# Altium footprint library Connectors.PcbLib: 155 footprints (part 2 of 10)
Each footprint in its own frame and in the unit in brackets; x right, y up, seen from the top. Pads: shape width x height; smd on the part's side, far side on the other; paste and mask are expansions set on the pad; w line width, h text height; cw(c..) or ccw(c..) is an arc to the next point about the centre after c.
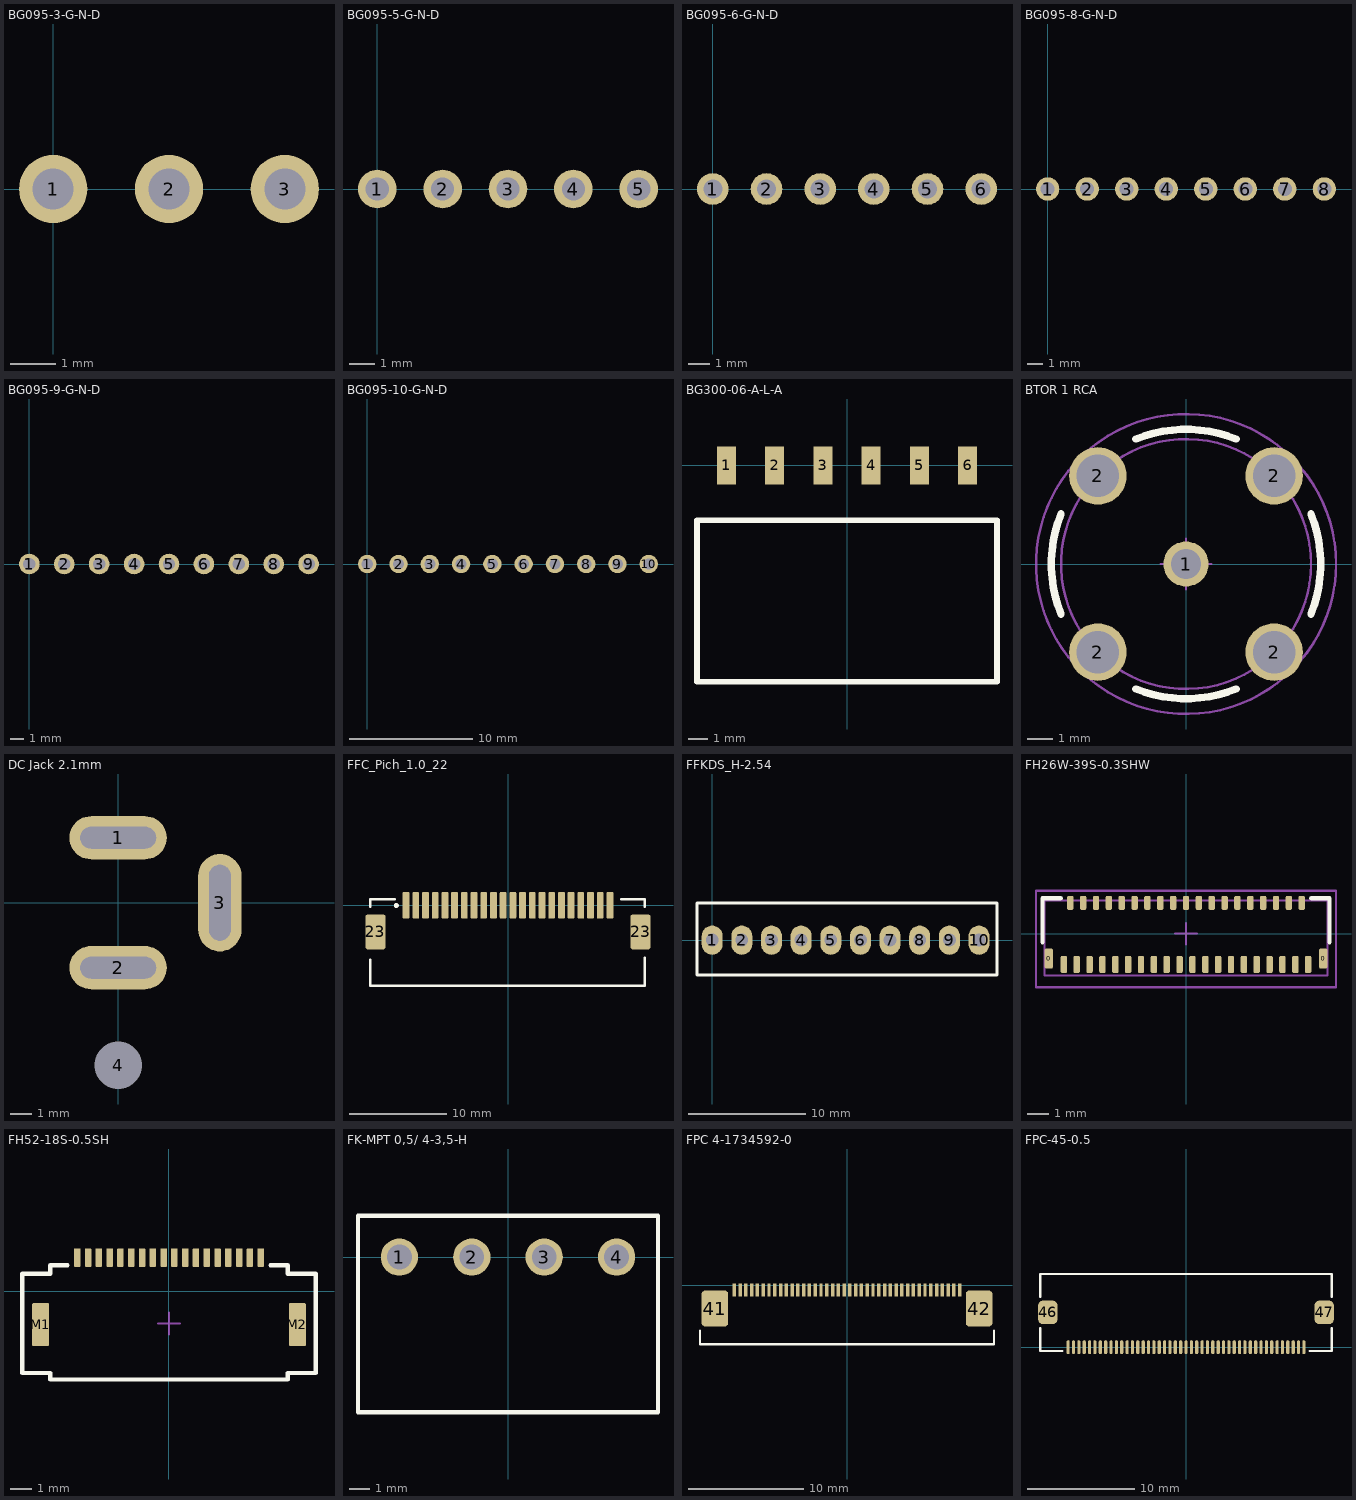
[diagram p1: the footprints below, top view; thin cyan lines are the x and y axes]

## BG095-3-G-N-D [mm] "BG095-3-G-N-D"
height 5
pads (3):
  round 1.5 hole 0.9: 1(0,0) 2(2.54,0) 3(5.08,0)
3D body: height 5, standoff -2.92, extent -1.32,-1.295 6.3,1.245

## BG095-5-G-N-D [mm] "BG095-5-G-N-D"
height 5
pads (5):
  round 1.5 hole 0.9: 1(0,0) 2(2.54,0) 3(5.08,0) 4(7.62,0) 5(10.16,0)
3D body: height 5, standoff -2.92, extent -1.325,-1.275 11.375,1.265

## BG095-6-G-N-D [mm] "BG095-6-G-N-D"
height 5
pads (6):
  round 1.5 hole 0.9: 1(0,0) 2(2.54,0) 3(5.08,0) 4(7.62,0) 5(10.16,0) 6(12.7,0)
3D body: height 5, standoff -2.92, extent -1.32,-1.295 13.92,1.245

## BG095-8-G-N-D [mm] "BG095-8-G-N-D"
height 5
pads (8):
  round 1.5 hole 0.9: 1(0,0) 2(2.54,0) 3(5.08,0) 4(7.62,0) 5(10.16,0) 6(12.7,0) 7(15.24,0) 8(17.78,0)
3D body: height 5, standoff -2.92, extent -1.32,-1.295 19,1.245

## BG095-9-G-N-D [mm] "BG095-9-G-N-D"
height 5
pads (9):
  round 1.5 hole 0.9: 1(0,0) 2(2.54,0) 3(5.08,0) 4(7.62,0) 5(10.16,0) 6(12.7,0) 7(15.24,0) 8(17.78,0) 9(20.32,0)
3D body: height 5, standoff -2.92, extent -1.32,-1.295 21.54,1.245

## BG095-10-G-N-D [mm] "BG095-10-G-N-D"
height 5
pads (10):
  round 1.5 hole 0.9: 1(0,0) 2(2.54,0) 3(5.08,0) 4(7.62,0) 5(10.16,0) 6(12.7,0) 7(15.24,0) 8(17.78,0) 9(20.32,0) 10(22.86,0)
3D body: height 5, standoff -2.92, extent -1.32,-1.295 21.54,1.245

## BG300-06-A-L-A [mm] "Board-To-Board Connector, Right Angle, White Lite"
pads (6):
  rect 1x2 smd: 1(-6.35,0) 2(-3.81,0) 3(-1.27,0) 4(1.27,0) 5(3.81,0) 6(6.35,0)
Top Overlay:
  lines w0.3: -7.9,-11.4 -7.9,-2.9 0,-2.9 7.9,-2.9 7.9,-11.4 -7.9,-11.4
3D body: height 2.5, standoff 0, extent -7.899,-11.399 7.899,-2.901

## BTOR 1 RCA [mm] "RCA connector from Lumberg"
height 17
pads (5):
  round 1.8 hole 1.2: 1(0,0)
  round 2.3 hole 1.7: 2(-3.525,-3.525) 2(-3.525,3.525) 2(3.525,-3.525) 2(3.525,3.525)
Top Overlay:
  lines w0.3: -5,-2 cw(c0,0) -5,2 ; -2,-5 ccw(c0,0) 2,-5 ; -2,5 cw(c0,0) 2,5 ; 5,-2 ccw(c0,0) 5,2
Mechanical 13:
  circle w0.1: c0,0 r5
Mechanical 15:
  circle w0.1: c0,0 r6
  lines w0.1: -1,0 1,0 ; 0,-1 0,1
3D body: height 17, standoff -5, extent -7.071,-7.071 7.071,7.071

## DC Jack 2.1mm [mm] "DC Jack 2.1mm"
pads (4):
  oval 4.5x2 hole 1 slot 3.5 at 0 deg: 1(0,3) 2(0,-3)
  oval 2x4.5 hole 1 slot 3.5 at 90 deg: 3(4.7,0)
  round 1 hole 2.2 unplated: 4(0,-7.5)
3D body: height 11, standoff -3.5, extent -4.478,-11.5 4.878,3.8

## FFC_Pich_1.0_22 [mm] "FFC_Pich_1.0_22"
height 2.7
pads (24):
  rrect25% 0.7x2.7 smd: 1(-10.5,0) 2(-9.5,0) 3(-8.5,0) 4(-7.5,0) 5(-6.5,0) 6(-5.5,0) 7(-4.5,0) 8(-3.5,0) 9(-2.5,0) 10(-1.5,0) 11(-0.5,0) 12(0.5,0) 13(1.5,0) 14(2.5,0) 15(3.5,0) 16(4.5,0) 17(5.5,0) 18(6.5,0) 19(7.5,0) 20(8.5,0) 21(9.5,0) 22(10.5,0)
  rrect25% 2.1x3.6 smd: 23(-13.65,-2.75) 23(13.65,-2.75)
Top Overlay:
  circle w0.254: c-11.5,-0.025 r0.125
  lines w0.254: -14.2,-5.6 -14.2,-8.3 14.1,-8.3 14.1,-5.4 ; -14.2,-0.15 -14.2,0.6 -11.65,0.6 ; 11.65,0.6 14.1,0.6 14.1,-0.15
3D body: height 2.7, standoff 0, extent -14.2,-8.3 14.1,0.6

## FFKDS_H-2.54 [mm] "FFKDS_H-2.54"
height 13.6
pads (10):
  oval 1.8x2.5 hole 1.1: 1(0,0) 2(2.54,0) 3(5.08,0) 4(7.62,0) 5(10.16,0) 6(12.7,0) 7(15.24,0) 8(17.78,0) 9(20.32,0) 10(22.86,0)
Top Overlay:
  lines w0.254: -1.3,-3 24.4,-3 24.4,3.2 -1.3,3.2 -1.3,-3

## FH26W-39S-0.3SHW [mm] "0.3mm Pitch, 2-row FPC Connector"
height 1
pads (41):
  rrect50% 0.4x0.95 smd: 0(-6.4,-1.162) 0(6.4,-1.163)
  rrect50% 0.3x0.8 smd: 1(-5.7,-1.438) 3(-5.1,-1.438) 5(-4.5,-1.438) 7(-3.9,-1.438) 9(-3.3,-1.438) 11(-2.7,-1.438) 13(-2.1,-1.438) 15(-1.5,-1.438) 17(-0.9,-1.438) 19(-0.3,-1.438) 21(0.3,-1.438) 23(0.9,-1.438) 25(1.5,-1.438) 27(2.1,-1.438) 29(2.7,-1.438) 31(3.3,-1.438) 33(3.9,-1.438) 35(4.5,-1.438) 37(5.1,-1.438) 39(5.7,-1.438)
  rrect50% 0.3x0.65 smd: 2(-5.4,1.438) 4(-4.8,1.438) 6(-4.2,1.438) 8(-3.6,1.438) 10(-3,1.438) 12(-2.4,1.438) 14(-1.8,1.438) 16(-1.2,1.438) 18(-0.6,1.438) 20(0,1.438) 22(0.6,1.438) 24(1.2,1.438) 26(1.8,1.438) 28(2.4,1.438) 30(3,1.438) 32(3.6,1.438) 34(4.2,1.438) 36(4.8,1.438) 38(5.4,1.438)
Top Overlay:
  lines w0.2: -6.7,-0.4 -6.7,1.6 -6.7,1.65 -5.85,1.65 ; 5.85,1.65 6.7,1.65 6.7,1.6 6.7,-0.4
Mechanical 13:
  lines w0.1: -6.6,-1.95 -6.6,1.55 6.6,1.55 6.6,-1.95 -6.6,-1.95
  text "1" at -5.8,-0.7 h0.6
  text "39" at 4.95,-0.7 h0.6
Mechanical 15:
  lines w0.1: -0.5,0 0.5,0 ; 0,-0.5 0,0.5 ; -7,-2.5 7,-2.5 7,2 -7,2 -7,-2.5
3D body: height 1, standoff 0, extent -6.6,-1.95 6.6,1.55

## FH52-18S-0.5SH [mm] "FFC connector"
height 2
pads (20):
  rrect20% 0.3x0.85 smd: 1(-4.25,1.55) 2(-3.75,1.55) 3(-3.25,1.55) 4(-2.75,1.55) 5(-2.25,1.55) 6(-1.75,1.55) 7(-1.25,1.55) 8(-0.75,1.55) 9(-0.25,1.55) 10(0.25,1.55) 11(0.75,1.55) 12(1.25,1.55) 13(1.75,1.55) 14(2.25,1.55) 15(2.75,1.55) 16(3.25,1.55) 17(3.75,1.55) 18(4.25,1.55)
  rrect20% 0.8x2 smd: M1(-5.95,-1.55) M2(5.95,-1.55)
Top Overlay:
  lines w0.2: -4.7,1.2 -5.5,1.2 -5.5,0.8 -6.8,0.8 -6.8,-3.8 -5.5,-3.8 -5.5,-4.1 5.5,-4.1 5.5,-3.8 6.8,-3.8 6.8,0.8 5.5,0.8 5.5,1.2 4.7,1.2
Mechanical 15:
  lines w0.1: -0.5,-1.5 0.5,-1.5 ; 0,-2 0,-1
3D body: height 2, standoff 0, extent -6.7,-4 6.7,1.1

## FK-MPT 0,5/ 4-3,5-H [mm] "FK-MPT 0,5/ 4-3,5-H - PCB terminal block, Phoenix Contact"
height 8.5
pads (4):
  round 1.8 hole 1.2: 1(-5.25,0) 2(-1.75,0) 3(1.75,0) 4(5.25,0)
Top Overlay:
  lines w0.2: -7.25,-7.5 -7.25,2 7.25,2 7.25,-7.5 -7.25,-7.5
3D body: height 8.5, standoff -4, extent -7.25,-7.5 7.25,2

## FPC 4-1734592-0 [mm] "FPC 4-1734592-0"
height 2
pads (42):
  rrect0% 0.3x1.1 smd: 1(-9.75,-0.425) 2(-9.25,-0.425) 3(-8.75,-0.425) 4(-8.25,-0.425) 5(-7.75,-0.425) 6(-7.25,-0.425) 7(-6.75,-0.425) 8(-6.25,-0.425) 9(-5.75,-0.425) 10(-5.25,-0.425) 11(-4.75,-0.425) 12(-4.25,-0.425) 13(-3.75,-0.425) 14(-3.25,-0.425) 15(-2.75,-0.425) 16(-2.25,-0.425) 17(-1.75,-0.425) 18(-1.25,-0.425) 19(-0.75,-0.425) 20(-0.25,-0.425) 21(0.25,-0.425) 22(0.75,-0.425) 23(1.25,-0.425) 24(1.75,-0.425) 25(2.25,-0.425) 26(2.75,-0.425) 27(3.25,-0.425) 28(3.75,-0.425) 29(4.25,-0.425) 30(4.75,-0.425) 31(5.25,-0.425) 32(5.75,-0.425) 33(6.25,-0.425) 34(6.75,-0.425) 35(7.25,-0.425) 36(7.75,-0.425) 37(8.25,-0.425) 38(8.75,-0.425) 39(9.25,-0.425) 40(9.75,-0.425)
  rrect25% 2.3x3.1 smd: 41(-11.43,-2.025) 42(11.43,-2.025)
Top Overlay:
  lines w0.2: -12.725,-3.925 -12.725,-5.125 12.725,-5.125 12.725,-3.925
3D body: height 2.05, standoff 0, extent -12.715,-5.11 12.715,0

## FPC-45-0.5 [mm]
pads (47):
  oval 0.3x1.3 smd: 1(-11,0) 2(-10.5,0) 3(-10,0) 4(-9.5,0) 5(-9,0) 6(-8.5,0) 7(-8,0) 8(-7.5,0) 9(-7,0) 10(-6.5,0) 11(-6,0) 12(-5.5,0) 13(-5,0) 14(-4.5,0) 15(-4,0) 16(-3.5,0) 17(-3,0) 18(-2.5,0) 19(-2,0) 20(-1.5,0) 21(-1,0) 22(-0.5,0) 23(0,0) 24(0.5,0) 25(1,0) 26(1.5,0) 27(2,0) 28(2.5,0) 29(3,0) 30(3.5,0) 31(4,0) 32(4.5,0) 33(5,0) 34(5.5,0) 35(6,0) 36(6.5,0) 37(7,0) 38(7.5,0) 39(8,0) 40(8.5,0) 41(9,0) 42(9.5,0) 43(10,0) 44(10.5,0) 45(11,0)
  rrect50% 1.8x2.2 smd: 46(-12.9,3.25) 47(12.9,3.25)
Top Overlay:
  lines w0.2: -13.6,1.8 -13.6,-0.35 -11.55,-0.35 ; -13.6,4.7 -13.6,6.85 13.6,6.85 13.6,4.7 ; 11.55,-0.35 13.6,-0.35 13.6,1.8
3D body: height 2.15, standoff 0, extent -13.5,-0.25 13.5,6.75